# Altium integrated library raphaelchang_Connectors.IntLib: 42 symbols
Pins are listed as number, name and electrical type; pins without a type are passive.

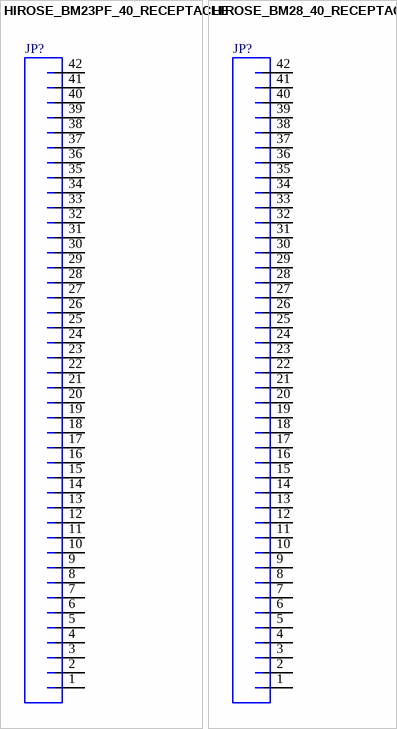
[diagram p0: symbols HIROSE_BM23PF_40_RECEPTACLE to HIROSE_BM28_40_RECEPTACLE]

## HIROSE_BM23PF_40_RECEPTACLE
designator JP?  (value not drawn)
CONN RCPT 0.35MM SMD 40POS; Manufacturer: Hirose; PartNumber: BM23PF0.8-40DS-0.35V(51); PackageReference: BM23PF-0.35; Mounting Technology: Surface Mount
footprint HIROSE-BM23PF-40-0.35MM-RECEPTACLE
pins: 1, 2, 3, 4, 5, 6, 7, 8, 9, 10, 11, 12, 13, 14, 15, 16, 17, 18, 19, 20, 21, 22, 23, 24, 25, 26, 27, 28, 29, 30, 31, 32, 33, 34, 35, 36, 37, 38, 39, 40, 41, 42

## HIROSE_BM28_40_RECEPTACLE
designator JP?  (value not drawn)
Board to Board & Mezzanine Connectors 40P Receptacle Straight SMT; Manufacturer: Hirose; PartNumber: BM28B0.6-40DS/2-0.35V(53); PackageReference: BM28-0.35; Mounting Technology: Surface Mount
footprint HIROSE-BM28-40-0.35MM-RECEPTACLE
pins: 1, 2, 3, 4, 5, 6, 7, 8, 9, 10, 11, 12, 13, 14, 15, 16, 17, 18, 19, 20, 21, 22, 23, 24, 25, 26, 27, 28, 29, 30, 31, 32, 33, 34, 35, 36, 37, 38, 39, 40, 41, 42


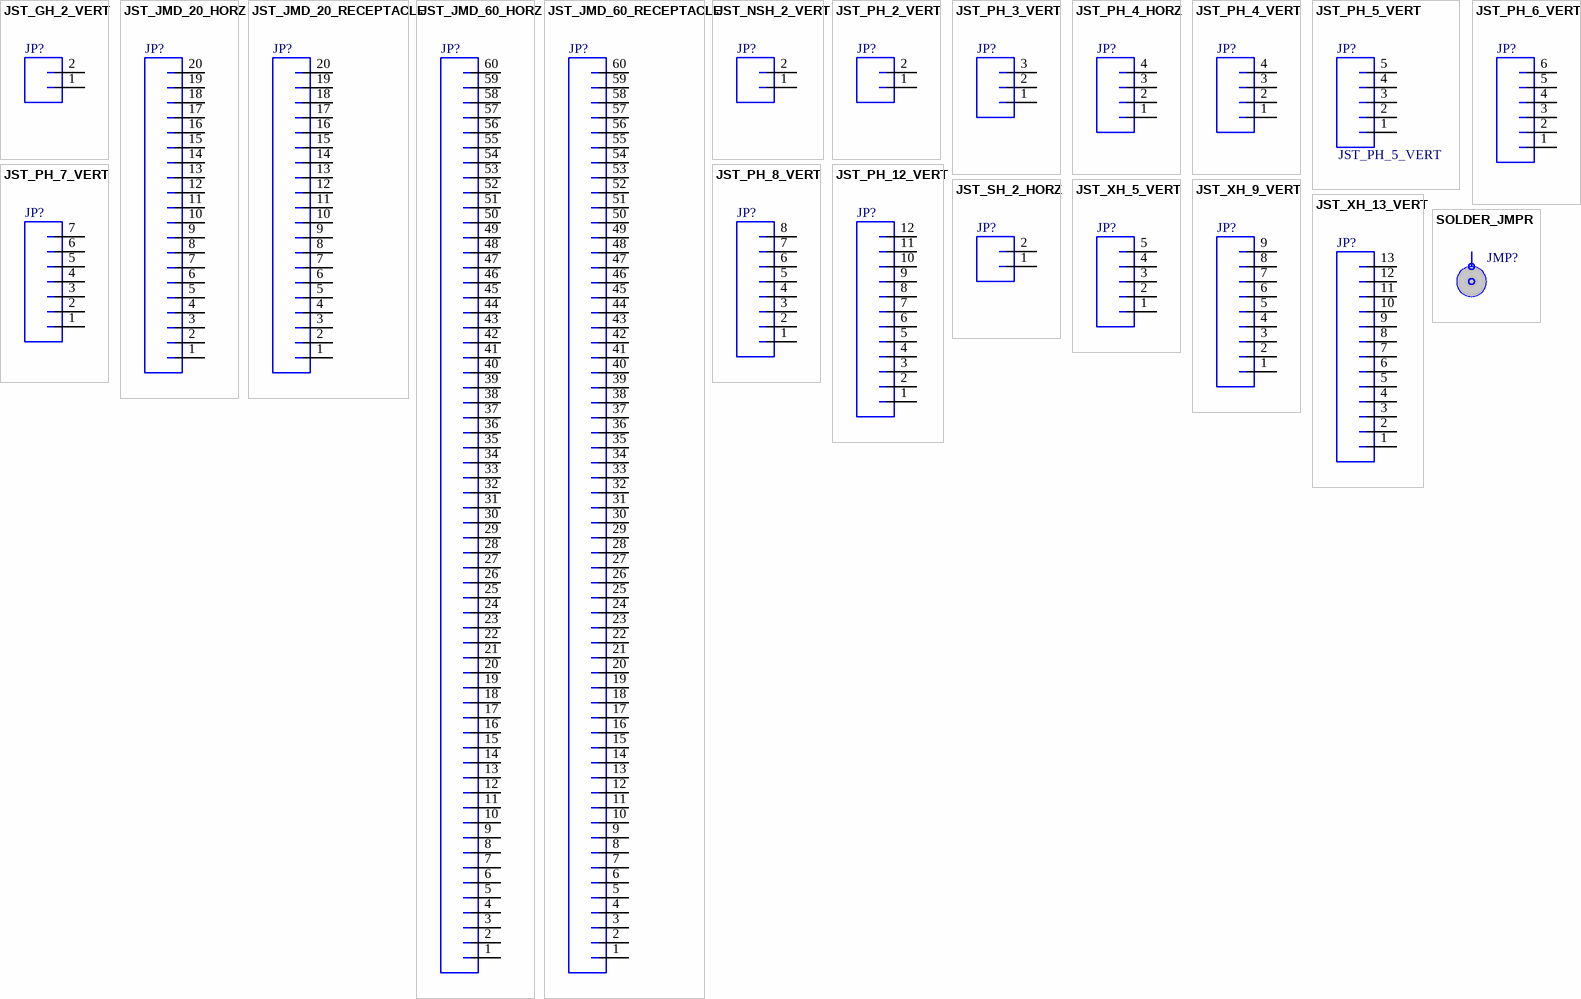
[diagram p1: symbols JST_GH_2_VERT to SOLDER_JMPR]

## JST_GH_2_VERT
designator JP?
Manufacturer: JST Sales America, Inc.; PartNumber: BM02B-GHS-TBT(LF)(SN)(N); Mounting Technology: Surface Mount; PackageReference: JST-GH
footprint JST-GH-2-SMD-VERT
pins: 1, 2

## JST_JMD_20_HORZ
designator JP?  (value not drawn)
Manufacturer: JST Sales America, Inc.; PartNumber: 20PS-JMDSS-G-1-TF; PackageReference: JMD-20; Mounting Technology: Surface Mount
footprint JST-JMD-20-SMD-HORZ
pins: 1, 2, 3, 4, 5, 6, 7, 8, 9, 10, 11, 12, 13, 14, 15, 16, 17, 18, 19, 20

## JST_JMD_20_RECEPTACLE
designator JP?  (value not drawn)
Manufacturer: JST Sales America, Inc.; PartNumber: 20R-JMDSS-G-1-TF(S); PackageReference: JMD-20; Mounting Technology: Surface Mount
footprint JST-JMD-20-SMD-RECEPTACLE
pins: 1, 2, 3, 4, 5, 6, 7, 8, 9, 10, 11, 12, 13, 14, 15, 16, 17, 18, 19, 20

## JST_JMD_60_HORZ
designator JP?  (value not drawn)
Manufacturer: JST Sales America, Inc.; PartNumber: 60PS-JMDSS-G-1-TF; PackageReference: JMD-60; Mounting Technology: Surface Mount
footprint JST-JMD-60-SMD-HORZ
pins: 1, 2, 3, 4, 5, 6, 7, 8, 9, 10, 11, 12, 13, 14, 15, 16, 17, 18, 19, 20, 21, 22, 23, 24, 25, 26, 27, 28, 29, 30, 31, 32, 33, 34, 35, 36, 37, 38, 39, 40, 41, 42, 43, 44, 45, 46, 47, 48, 49, 50, 51, 52, 53, 54, 55, 56, 57, 58, 59, 60

## JST_JMD_60_RECEPTACLE
designator JP?  (value not drawn)
Manufacturer: JST Sales America, Inc.; PartNumber: 60R-JMDSS-G-1-TF(S); PackageReference: JMD-60; Mounting Technology: Surface Mount
footprint JST-JMD-60-SMD-RECEPTACLE
pins: 1, 2, 3, 4, 5, 6, 7, 8, 9, 10, 11, 12, 13, 14, 15, 16, 17, 18, 19, 20, 21, 22, 23, 24, 25, 26, 27, 28, 29, 30, 31, 32, 33, 34, 35, 36, 37, 38, 39, 40, 41, 42, 43, 44, 45, 46, 47, 48, 49, 50, 51, 52, 53, 54, 55, 56, 57, 58, 59, 60

## JST_NSH_2_VERT
designator JP?
Manufacturer: JST Sales America, Inc.; PartNumber: BM02B-NSHSS-TBT(LF)(SN); Mounting Technology: Surface Mount; PackageReference: JST-NSH
footprint JST-NSH-2-SMD-VERT
pins: 1, 2

## JST_PH_2_VERT
designator JP?
Manufacturer: JST Sales America, Inc.; PartNumber: B2B-PH-K-S(LF)(SN); Mounting Technology: Through Hole; PackageReference: JST-PH
footprint JST-PH-2-PTH-VERT
pins: 1, 2

## JST_PH_3_VERT
designator JP?
footprint JST-PH-3-PTH-VERT
pins: 1, 2, 3

## JST_PH_4_HORZ
designator JP?
PartNumber: S4B-PH-K-S(LF)(SN); Manufacturer: JST Sales America Inc.; PackageReference: JST-PH; Mounting Technology: Through Hole
footprint JST-PH-4-PTH-HORZ
pins: 1, 2, 3, 4

## JST_PH_4_VERT
designator JP?
PartNumber: B4B-PH-K-S(LF)(SN); Manufacturer: JST Sales America Inc.; PackageReference: JST-PH; Mounting Technology: Through Hole
footprint JST-PH-4-PTH-VERT
pins: 1, 2, 3, 4

## JST_PH_5_VERT
designator JP?
Manufacturer: JST Sales America, Inc.; PartNumber: B5B-PH-K-S(LF)(SN); PackageReference: JST-PH; Mounting Technology: Through Hole
footprint JST-PH-5-PTH-VERT
pins: 1, 2, 3, 4, 5

## JST_PH_6_VERT
designator JP?
PartNumber: B6B-PH-K-S(LF)(SN); Manufacturer: JST Sales America Inc.; PackageReference: JST-PH; Mounting Technology: Through Hole
footprint JST-PH-6-PTH-VERT
pins: 1, 2, 3, 4, 5, 6

## JST_PH_7_VERT
designator JP?
PartNumber: B7B-PH-K-S(LF)(SN); Manufacturer: JST Sales America Inc.; Mounting Technology: Through Hole; PackageReference: JST-PH
footprint JST-PH-7-PTH-VERT
pins: 1, 2, 3, 4, 5, 6, 7

## JST_PH_8_VERT
designator JP?
footprint JST-PH-8-PTH-VERT
pins: 1, 2, 3, 4, 5, 6, 7, 8

## JST_PH_12_VERT
designator JP?
footprint JST-PH-12-PTH-VERT
pins: 1, 2, 3, 4, 5, 6, 7, 8, 9, 10, 11, 12

## JST_SH_2_HORZ
designator JP?
Manufacturer: JST Sales America, Inc.; PartNumber: SM02B-SRSS-TB; Mounting Technology: Surface Mount; PackageReference: JST-SH
footprint JST-SH-2-SMD-HORZ
pins: 1, 2

## JST_XH_5_VERT
designator JP?
Manufacturer: JST Sales America, Inc.; PartNumber: B5B-XH-A(LF)(SN); Mounting Technology: Through Hole; PackageReference: JST-XH
footprint JST-XH-5-PTH-VERT
pins: 1, 2, 3, 4, 5

## JST_XH_9_VERT
designator JP?
Manufacturer: JST Sales America, Inc.; PartNumber: B9B-XH-A(LF)(SN); Mounting Technology: Through Hole; PackageReference: JST-XH
footprint JST-XH-9-PTH-VERT
pins: 1, 2, 3, 4, 5, 6, 7, 8, 9

## JST_XH_13_VERT
designator JP?
Manufacturer: JST Sales America, Inc.; PartNumber: B13B-XH-A(LF)(SN); Mounting Technology: Through Hole; PackageReference: JST-XH
footprint JST-XH-13-PTH-VERT
pins: 1, 2, 3, 4, 5, 6, 7, 8, 9, 10, 11, 12, 13

## SOLDER_JMPR
designator JMP?, comment Solder Jumper  (value not drawn)
footprint SOLDER-JUMPER
pins: 1, 2


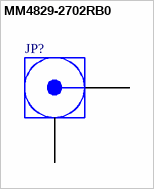
[diagram p2: symbol MM4829-2702RB0]

## MM4829-2702RB0
designator JP?  (value not drawn)
CONN HSC RCPT STR 50 OHM SMD; Manufacturer: Murata; PackageReference: HSC; PartNumber: MM4829-2702RB0; Mounting Technology: Surface Mount
footprint COAX-HSC
pins: 1 (power), 2 (power)


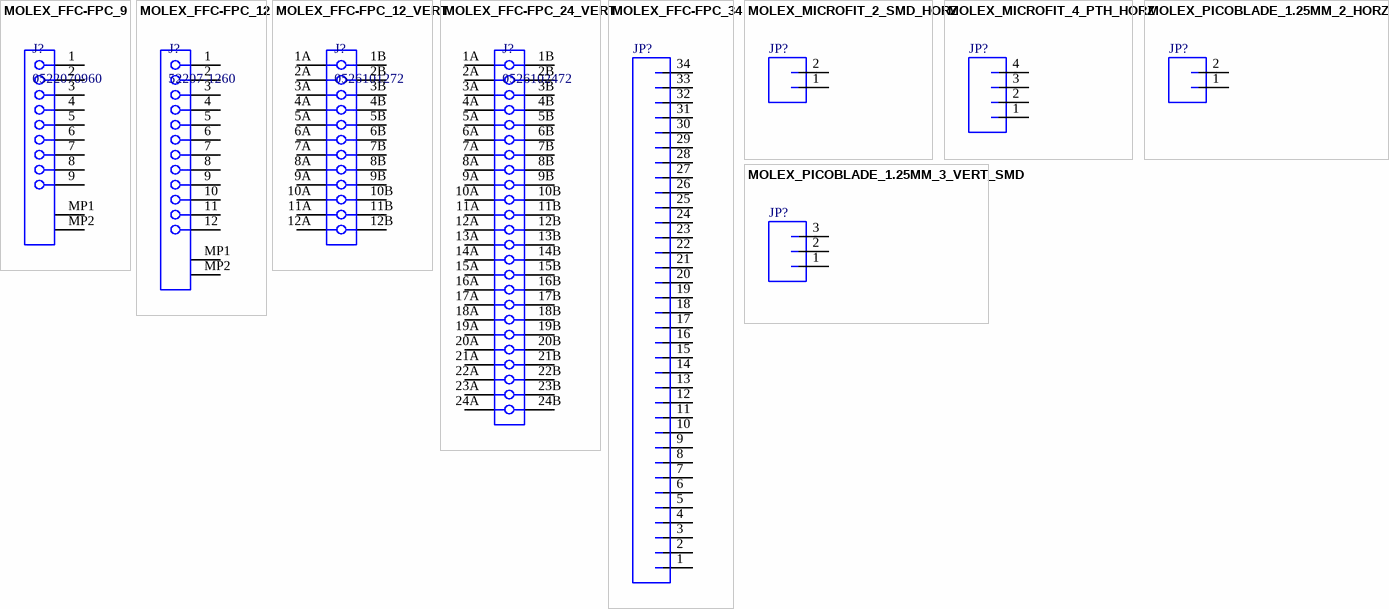
[diagram p3: symbols MOLEX_FFC-FPC_9 to MOLEX_PICOBLADE_1.25MM_3_VERT_SMD]

## MOLEX_FFC-FPC_9
designator J?, comment 0522070960
1.0 mm Pitch Easy-On(TM) Type FPC Connector, 2.7 mm Mated Height, Right Angle, ZIF, SMT, Top Contact, 9 Circuits, -30 to 85 degC, ELV and RoHS Compliant, Tape and Reel; Manufacturer: Molex; Polarized to PCB: Yes; Material - Metal: Phosphor Bronze; Material - Plating Termination: Tin; Mated Height: 2.70mm; Pitch - Mating Interface: 1.00mm; Entry Angle: 90degrees Angle; Current (Max per Contact): 1A; Durability (mating cycles max): 30; Circuits (Loaded): 9; Voltage (Max): 125V; Material - Plating Mating: Gold; PCB Locator: No; PartNumber: 0522070960; Number of Rows: 1; ComponentLink1Description: Manufacturer URL; Packing: Tape and Reel; RoHS: TRUE; ComponentLink1URL: http://www.molex.com/molex/index.jsp; PCB Retention: Yes; PackageReference: 0522070960; ComponentLink3Description: Package Specification; Pitch - Termination Interface: 1.00mm; Contact Position: Top; ComponentLink2Description: Datasheet; ComponentLink2URL: http://www.molex.com/webdocs/datasheets/pdf/en-us/0522070960_FFC_FPC_CONNECTORS.pdf; Stackable: No; ComponentLink3URL: http://www.molex.com/pdm_docs/sd/522070960_sd.pdf; Orientation: Right Angle; PackageDescription: 9-Lead FPC Connector, Pitch 1.0 mm; PackageVersion: Rev. F, 03/2007; Mounting Technology: Surface Mount
footprint MOLEX-FFC-FPC-1MM-9 (FPC Connector, 9-Leads, Right Angle, Pitch 1.0 mm, Mated Height 2.7 mm, SMT)
pins: 1, 2, 3, 4, 5, 6, 7, 8, 9, MP1, MP2

## MOLEX_FFC-FPC_12
designator J?, comment 52207-1260
1.0 mm Pitch Easy-On(TM) Type FPC Connector, 2.7 mm Mated Height, Right Angle, ZIF, SMT, Top Contact, 12 Circuits, -30 to 85 degC, ELV and RoHS Compliant, Tape and Reel; Manufacturer: Molex; Material - Plating Mating: Gold; Material - Metal: Phosphor Bronze; Voltage (Max): 125V; PCB Locator: No; Circuits (Loaded): 12; PCB Retention: Yes; Pitch - Termination Interface: 1.00mm; Current (Max per Contact): 1A; Mated Height: 2.70mm; Material - Plating Termination: Tin; Entry Angle: 90degrees Angle; Durability (mating cycles max): 30; ComponentLink3Description: Package Specification; Orientation: Right Angle; ComponentLink1Description: Manufacturer URL; PackageVersion: Rev. F, 03/2007; PackageReference: 522071260; RoHS: TRUE; Contact Position: Top; ComponentLink2URL: http://www.molex.com/webdocs/datasheets/pdf/en-us/0522071260_FFC_FPC_CONNECTORS.pdf; ComponentLink2Description: Datasheet; Pitch - Mating Interface: 1.00mm; Packing: Tape and Reel; PackageDescription: 12-Lead FPC Connector, Pitch 1.0 mm; ComponentLink1URL: http://www.molex.com/molex/index.jsp; Mounting Technology: Surface Mount; PartNumber: 52207-1260; Number of Rows: 1; Stackable: No; Polarized to PCB: Yes; ComponentLink3URL: http://www.molex.com/pdm_docs/sd/522071260_sd.pdf
footprint MOLEX-FFC-FPC-1MM-12 (FPC Connector, 12-Leads, Right Angle, Pitch 1.0 mm, Mated Height 2.7 mm, SMT)
pins: 1, 2, 3, 4, 5, 6, 7, 8, 9, 10, 11, 12, MP1, MP2

## MOLEX_FFC-FPC_12_VERT
designator J?, comment 0526101272
1.0 mm Pitch Easy-On(TM) Type FPC Connector, 5.75 mm Mated Height, Vertical, ZIF, SMT, 12 Circuits, -40 to 85 degC, ELV and RoHS Compliant, Tape and Reel; Manufacturer: Molex; PCB Retention: None; Material - Metal: Phosphor Bronze; PCB Locator: No; Current (Max per Contact): 1A; Material - Plating Mating: Gold; Circuits (Loaded): 12; Material - Plating Termination: Tin; Pitch - Mating Interface: 1.00mm; Mated Height: 5.75mm; Durability (mating cycles max): 30; Voltage (Max): 125V AC (RMS)/DC; ComponentLink2URL: http://www.molex.com/webdocs/datasheets/pdf/en-us/0526101272_FFC_FPC_CONNECTORS.pdf; Orientation: Vertical; PackageDescription: 12-Lead FPC Connector, Pitch 1.0 mm; ComponentLink2Description: Datasheet; Polarized to PCB: No; ComponentLink1Description: Manufacturer URL; Entry Angle: Vertical; PartNumber: 0526101272; PackageReference: 0526101272; Contact Position: N/A; Mounting Technology: Surface Mount; Stackable: No; ComponentLink3URL: http://www.molex.com/pdm_docs/sd/526101272_sd.pdf; ComponentLink1URL: http://www.molex.com/molex/index.jsp; Number of Rows: 1; RoHS: TRUE; PackageVersion: Rev. G, 02/2012; Packing: Tape and Reel; ComponentLink3Description: Package Specification
footprint MOLEX-FFC-FPC-1MM-12-VERT (FPC Connector, 12-Leads, Vertical, Pitch 1.0 mm, Mated Height 5.75 mm, SMT)
pins: 1A, 1B, 2A, 2B, 3A, 3B, 4A, 4B, 5A, 5B, 6A, 6B, 7A, 7B, 8A, 8B, 9A, 9B, 10A, 10B, 11A, 11B, 12A, 12B

## MOLEX_FFC-FPC_24_VERT
designator J?, comment 0526102472
1.0 mm Pitch Easy-On(TM) Type FPC Connector, 5.75 mm Mated Height, Vertical, ZIF, SMT, 24 Circuits, -40 to 85 degC, ELV and RoHS Compliant, Tape and Reel; Manufacturer: Molex; Pitch - Mating Interface: 1.00mm; Material - Plating Mating: Gold; Voltage (Max): 125V AC (RMS)/DC; Stackable: No; Circuits (Loaded): 24; Mated Height: 5.75mm; Material - Metal: Phosphor Bronze; Durability (mating cycles max): 30; Current (Max per Contact): 1A; PCB Retention: None; Material - Plating Termination: Tin; Packing: Tape and Reel; Contact Position: N/A; RoHS: TRUE; ComponentLink2Description: Datasheet; PackageReference: 0526102472; PackageVersion: Rev. G, 02/2012; ComponentLink1URL: http://www.molex.com/molex/index.jsp; PackageDescription: 24-Lead FPC Connector, Pitch 1.0 mm; ComponentLink3Description: Package Specification; Mounting Technology: Surface Mount; Orientation: Vertical; Number of Rows: 1; ComponentLink3URL: http://www.molex.com/pdm_docs/sd/526102472_sd.pdf; ComponentLink2URL: http://www.molex.com/webdocs/datasheets/pdf/en-us/0526102472_FFC_FPC_CONNECTORS.pdf; Polarized to PCB: No; Entry Angle: Vertical; ComponentLink1Description: Manufacturer URL; PCB Locator: No; PartNumber: 0526102472
footprint MOLEX-FFC-FPC-1MM-24-VERT (FPC Connector, 24-Leads, Vertical, Pitch 1.0 mm, Mated Height 5.75 mm, SMT)
pins: 1A, 1B, 2A, 2B, 3A, 3B, 4A, 4B, 5A, 5B, 6A, 6B, 7A, 7B, 8A, 8B, 9A, 9B, 10A, 10B, 11A, 11B, 12A, 12B, 13A, 13B, 14A, 14B, 15A, 15B, 16A, 16B, 17A, 17B, 18A, 18B, 19A, 19B, 20A, 20B, 21A, 21B, 22A, 22B, 23A, 23B, 24A, 24B

## MOLEX_FFC-FPC_34
designator JP?  (value not drawn)
Manufacturer: Molex; PartNumber: 51296-3494; PackageReference: FFC-FPC-0.5; Mounting Technology: Surface Mount
footprint MOLEX-FFC-FPC-0.5MM-34
pins: 1, 2, 3, 4, 5, 6, 7, 8, 9, 10, 11, 12, 13, 14, 15, 16, 17, 18, 19, 20, 21, 22, 23, 24, 25, 26, 27, 28, 29, 30, 31, 32, 33, 34

## MOLEX_MICROFIT_2_SMD_HORZ
designator JP?
Manufacturer: Molex; PartNumber: 43650-0212; Mounting Technology: Surface Mount; PackageReference: Microfit-3.0mm
footprint MOLEX-MICROFIT-2-SMD-HORZ (Micro-Fit 3.0™ Right Angle Header, 3.00mm Pitch, Single Row, 2 Circuits, with Solder Tab, Tin, Glow Wire Capable, Black)
pins: 1, 2

## MOLEX_MICROFIT_4_PTH_HORZ
designator JP?
Manufacturer: Molex; PartNumber: 43045-0400; Mounting Technology: Surface Mount; PackageReference: Microfit-3.0mm
footprint MOLEX-MICROFIT-4-PTH-HORZ
pins: 1, 2, 3, 4

## MOLEX_PICOBLADE_1.25MM_2_HORZ_SMD
designator JP?
Manufacturer: Molex; PartNumber: 53261-0271; Mounting Technology: Surface Mount; PackageReference: PicoBlade-1.25mm
footprint MOLEX-PICOBLADE-1.25MM-2-HORZ-SMD
pins: 1, 2

## MOLEX_PICOBLADE_1.25MM_3_VERT_SMD
designator JP?
Manufacturer: Molex; PartNumber: 0533980371; Mounting Technology: Surface Mount; PackageReference: PicoBlade-1.25mm
footprint MOLEX-PICOBLADE-1.25MM-3-VERT-SMD
pins: 1, 2, 3


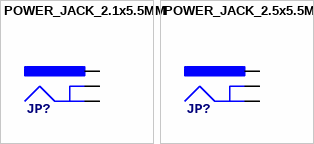
[diagram p4: symbols POWER_JACK_2.1x5.5MM to POWER_JACK_2.5x5.5MM]

## POWER_JACK_2.1x5.5MM
designator JP?
Manufacturer: CUI Inc.; PartNumber: PJ-036AH-SMT-TR; Mounting Technology: Surface Mount; PackageReference: 2X5.5MM
footprint POWER-JACK-2.1X5.5MM-SMD
pins: 1 PWR, 2 GND, 3 GND

## POWER_JACK_2.5x5.5MM
designator JP?
Manufacturer: CUI Inc.; PartNumber: PJ-002BH-SMT-TR; Mounting Technology: Surface Mount; PackageReference: 2.5X5.5MM
footprint POWER-JACK-2.5X5.5MM-SMD
pins: 1 PWR, 2 GND, 3 GND


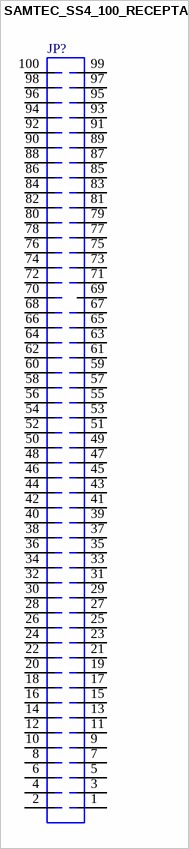
[diagram p5: symbol SAMTEC_SS4_100_RECEPTACLE]

## SAMTEC_SS4_100_RECEPTACLE
designator JP?  (value not drawn)
Manufacturer: Samtec; PartNumber: SS4-50-3.00-L-D-K-TR; PackageReference: SS4-100; Mounting Technology: Surface Mount
footprint SAMTEC-SS4-100-RECEPTACLE
pins: 1, 2, 3 2, 4 3, 5 3, 6 4, 7 4, 8 5, 9 5, 10 6, 11 6, 12 7, 13 7, 14 8, 15 8, 16 9, 17 9, 18 10, 19 10, 20 11, 21 11, 22 12, 23 12, 24 13, 25 13, 26 14, 27 14, 28 15, 29 15, 30 16, 31 16, 32 17, 33 17, 34 18, 35 18, 36 19, 37 19, 38 20, 39 20, 40 21, 41 21, 42 22, 43 22, 44 23, 45 23, 46 24, 47 24, 48 25, 49 25, 50 26, 51 26, 52 27, 53 27, 54 28, 55 28, 56 29, 57 29, 58 30, 59 30, 60 31, 61 31, 62 32, 63 32, 64 33, 65 33, 66 34, 67 34, 68 35, 69 35, 70 36, 71 36, 72 37, 73 37, 74 38, 75 38, 76 39, 77 39, 78 40, 79 40, 80 41, 81 41, 82 42, 83 42, 84 43, 85 43, 86 44, 87 44, 88 45, 89 45, 90 46, 91 46, 92 47, 93 47, 94 48, 95 48, 96 49, 97 49, 98 50, 99 50, 100 51


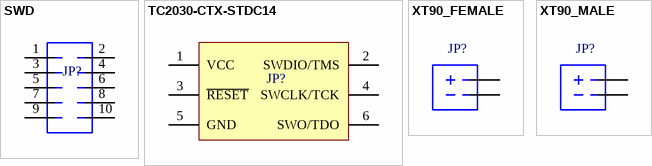
[diagram p6: symbols SWD to XT90_MALE]

## SWD
designator JP?, comment 1.27mm SWD Connector  (value not drawn)
Manufacturer: Samtec; PartNumber: FTSH-105-01-F-DV; Mounting Technology: SMD; PackageReference: Header-1.27mm-2x5
footprint SWD-SMD
pins: 1, 2, 3, 4, 5, 6, 7, 8, 9, 10

## TC2030-CTX-STDC14
designator JP?  (value not drawn)
Manufacturer: Tag-Connect; Mounting Technology: N/A; PartNumber: TC2030-CTX-STDC14
footprint TC2030-CTX-STDC14
pins: 1 VCC, 2 SWDIO/TMS, 3 ~{RESET}, 4 SWCLK/TCK, 5 GND, 6 SWO/TDO

## XT90_FEMALE
designator JP?
Mounting Technology: Through Hole; PackageReference: XT90
footprint XT90-FEMALE
pins: +, -

## XT90_MALE
designator JP?
Mounting Technology: Through Hole; PackageReference: XT90
footprint XT90-MALE
pins: +, -


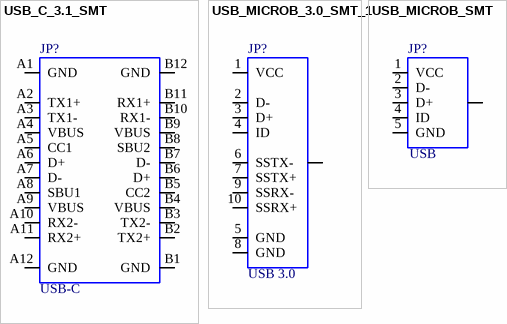
[diagram p7: symbols USB_C_3.1_SMT to USB_MICROB_SMT]

## USB_C_3.1_SMT
designator JP?, comment USB-C
PartNumber: 12401610E4#2A; Manufacturer: Amphenol FCI; Mounting Technology: Surface Mount; PackageReference: USB 3.1 - Type C
footprint USB-C-3.1
pins: A1 GND (power), A2 TX1+, A3 TX1-, A4 VBUS (power), A5 CC1, A6 D+, A7 D-, A8 SBU1, A9 VBUS (power), A10 RX2-, A11 RX2+, A12 GND (power), B1 GND (power), B2 TX2+, B3 TX2-, B4 VBUS (power), B5 CC2, B6 D+, B7 D-, B8 SBU2, B9 VBUS (power), B10 RX1-, B11 RX1+, B12 GND (power)

## USB_MICROB_3.0_SMT_1
designator JP?, comment USB 3.0
PartNumber: GSB343133HR; Manufacturer: Amphenol FCI; Mounting Technology: Surface Mount; PackageReference: USB 3.0 - Micro B
footprint USB-MICROB-3.0
pins: 1 VCC (power), 2 D-, 3 D+, 4 ID, 5 GND (power), 6 SSTX-, 7 SSTX+, 8 GND (power), 9 SSRX- (power), 10 SSRX+ (power), 11 SHIELD

## USB_MICROB_SMT
designator JP?, comment USB
PartNumber: 10118192-0001LF; Manufacturer: Amphenol FCI; Mounting Technology: Surface Mount; PackageReference: USB - Micro B
footprint USB-MICROB; pin to pad 1>VBUS 2>D- 3>D+ 4>ID 5>GND 6>MT1+P$1+P$2+MT2
pins: 1 VCC, 2 D-, 3 D+, 4 ID, 5 GND, 6 SHIELD